# Altium footprint library Inductor.PcbLib: 75 footprints (part 3 of 5)
Each footprint in its own frame and in the unit in brackets; x right, y up, seen from the top. Pads: shape width x height; smd on the part's side, far side on the other; paste and mask are expansions set on the pad; w line width, h text height; cw(c..) or ccw(c..) is an arc to the next point about the centre after c.
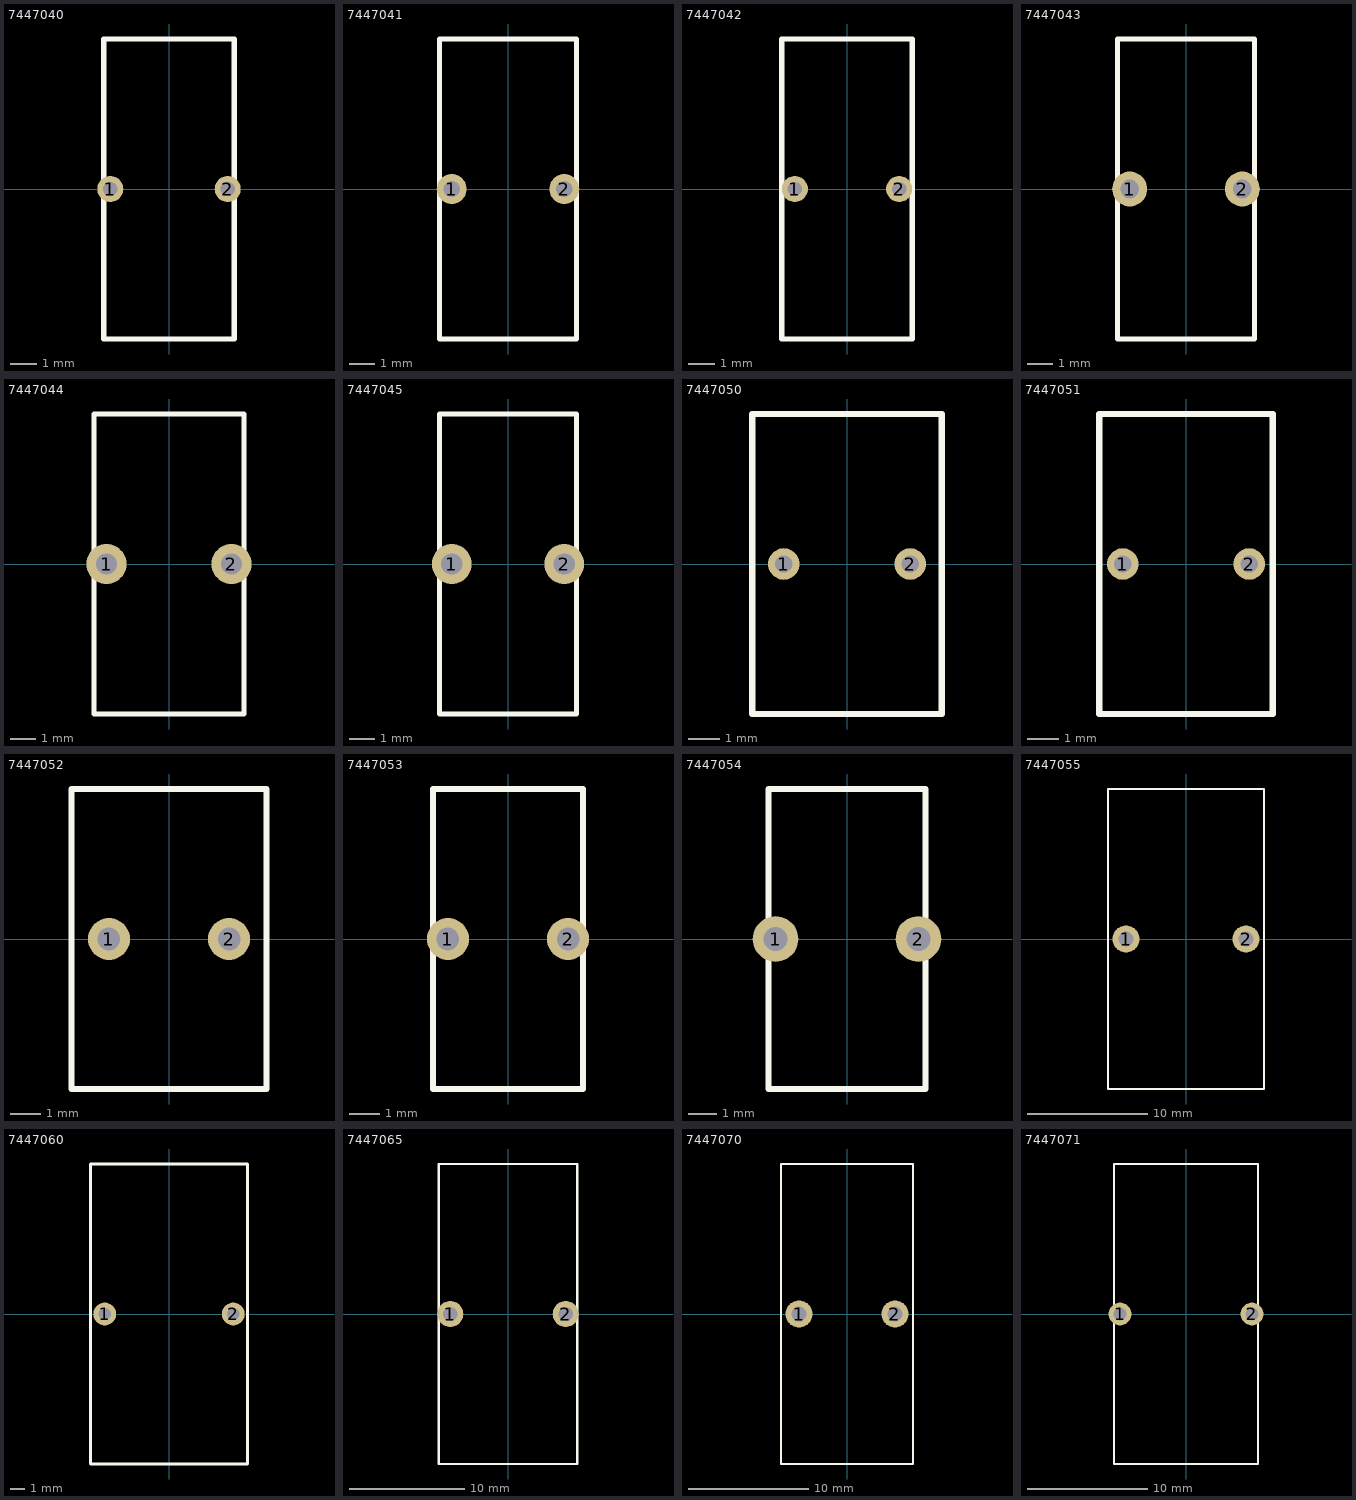
[diagram p2: the footprints below, top view; thin cyan lines are the x and y axes]

## 7447040 [mm] "Body 11.5x5mm, 2 leads"
height 11.5
pads (2):
  round 1 hole 0.55: 1(-2.25,0) 2(2.25,0)
Top Overlay:
  lines w0.2: -2.5,-5.75 -2.5,5.75 2.5,5.75 2.5,-5.75 -2.5,-5.75
3D body "7447040.stp": height 12.31, standoff -14.5, extent -2.821,-6.066 2.821,6.067

## 7447041 [mm] "Body 12x5.5mm, 2 leads"
height 12
pads (2):
  round 1.2 hole 0.65: 1(-2.25,0) 2(2.25,0)
Top Overlay:
  lines w0.2: -2.75,-6 2.75,-6 2.75,6 -2.75,6 -2.75,-6
3D body "7447041.stp": height 12.89, standoff -14.5, extent -3.17,-6.411 3.17,6.412

## 7447042 [mm] "Body 11.5x5mm, 2 leads"
height 11.5
pads (2):
  round 1 hole 0.55: 1(-2,0) 2(2,0)
Top Overlay:
  lines w0.2: -2.5,-5.75 -2.5,5.75 2.5,5.75 2.5,-5.75 -2.5,-5.75
3D body "7447042.stp": height 12.56, standoff -14.25, extent -2.821,-6.066 2.821,6.067

## 7447043 [mm] "Body 12x5.5mm, 2 leads"
height 12
pads (2):
  round 1.4 hole 0.75: 1(-2.25,0) 2(2.25,0)
Top Overlay:
  lines w0.2: -2.75,-6 2.75,-6 2.75,6 -2.75,6 -2.75,-6
3D body "7447043.stp": height 13.49, standoff -14, extent -3.26,-6.504 3.26,6.505

## 7447044 [mm] "Body 12x6mm, 2 leads"
height 12
pads (2):
  round 1.6 hole 0.85: 1(-2.5,0) 2(2.5,0)
Top Overlay:
  lines w0.2: -3,-6 3,-6 3,6 -3,6 -3,-6
3D body "7447044.stp": height 13.56, standoff -14, extent -3.62,-6.604 3.62,6.605

## 7447045 [mm] "Body 12x5.5mm, 2 leads"
height 12
pads (2):
  round 1.6 hole 0.85: 1(-2.25,0) 2(2.25,0)
Top Overlay:
  lines w0.2: -2.75,-6 -2.75,6 2.75,6 2.75,-6 -2.75,-6
3D body "7447045.stp": height 13.62, standoff -14, extent -3.37,-6.618 3.37,6.62

## 7447050 [mm] "Body 9.5x6mm, 2 leads"
height 9.5
pads (2):
  round 1 hole 0.55: 1(-2,0) 2(2,0)
Top Overlay:
  lines w0.2: -3,-4.75 -3,4.75 3,4.75 3,-4.75 -3,-4.75
3D body "7447050.stp": height 9.75, standoff -14.4, extent -2.85,-4.749 2.85,4.749

## 7447051 [mm] "Body 9.5x5.5mm, 2 leads"
height 9.5
pads (2):
  round 1 hole 0.55: 1(-2,0) 2(2,0)
Top Overlay:
  lines w0.2: -2.75,-4.75 2.75,-4.75 2.75,4.75 -2.75,4.75 -2.75,-4.75
3D body "7447051.stp": height 10.07, standoff -14.75, extent -2.57,-5.049 2.57,5.049

## 7447052 [mm] "Body 10x6.5mm, 2 leads"
height 10
pads (2):
  round 1.4 hole 0.75: 1(-2,0) 2(2,0)
Top Overlay:
  lines w0.2: -3.25,-5 3.25,-5 3.25,5 -3.25,5 -3.25,-5
3D body "7447052.stp": height 10.98, standoff -14.5, extent -3.26,-5.502 3.26,5.502

## 7447053 [mm] "Body 10x5mm, 2 leads"
height 10
pads (2):
  round 1.4 hole 0.75: 1(-2,0) 2(2,0)
Top Overlay:
  lines w0.2: -2.5,-5 2.5,-5 2.5,5 -2.5,5 -2.5,-5
3D body "7447053.stp": height 10.99, standoff -14.5, extent -3.01,-5.503 3.01,5.502

## 7447054 [mm] "Body 10.5x5.5mm, 2 leads"
height 10.5
pads (2):
  round 1.6 hole 0.85: 1(-2.5,0) 2(2.5,0)
Top Overlay:
  lines w0.2: -2.75,-5.25 -2.75,5.25 2.75,5.25 2.75,-5.25 -2.75,-5.25
3D body "7447054.stp": height 11.72, standoff -14.35, extent -3.371,-5.857 3.37,5.857

## 7447055 [mm] "Body 25x13mm, 2 leads"
height 25
pads (2):
  round 2.25 hole 1.25: 1(-5,0) 2(5,0)
Top Overlay:
  lines w0.2: -6.5,-12.5 -6.5,12.5 6.5,12.5 6.5,-12.5 -6.5,-12.5
3D body "Download_STP_7447055.stp": height 25.48, standoff -14.5, extent -4.75,-12.494 4.75,12.493

## 7447060 [mm] "Body 21x11mm, 2 leads"
height 21
pads (2):
  round 1.6 hole 0.85: 1(-4.5,0) 2(4.5,0)
Top Overlay:
  lines w0.2: -5.5,-10.5 -5.5,10.5 5.5,10.5 5.5,-10.5 -5.5,-10.5
3D body "7447060.stp": height 23.1, standoff -23.5, extent -6.12,-11.114 6.12,11.115

## 7447065 [mm] "Body 26x12mm, 2 leads"
height 26
pads (2):
  round 2.25 hole 1.25: 1(-5,0) 2(5,0)
Top Overlay:
  lines w0.2: -6,-13 6,-13 6,13 -6,13 -6,-13
3D body "7447065.stp": height 25.48, standoff -14.5, extent -4.75,-12.494 4.75,12.493

## 7447070 [mm] "Body 25x11mm, 2 leads"
height 25
pads (2):
  round 2.25 hole 1.25: 1(-4,0) 2(4,0)
Top Overlay:
  lines w0.2: -5.5,-12.5 -5.5,12.5 5.5,12.5 5.5,-12.5 -5.5,-12.5
3D body "7447070.stp": height 27.48, standoff -13.5, extent -6.52,-13.508 6.52,13.509

## 7447071 [mm] "Body 25x12mm, 2 leads"
height 25
pads (2):
  round 1.9 hole 1.05: 1(-5.5,0) 2(5.5,0)
Top Overlay:
  lines w0.2: -6,-12.5 -6,12.5 6,12.5 6,-12.5 -6,-12.5
3D body "7447071.stp": height 27.3, standoff -23.5, extent -6.82,-13.312 6.82,13.312